# Altium footprint library mobinbyn-Socket.PcbLib: 131 footprints (part 4 of 9)
Each footprint in its own frame and in the unit in brackets; x right, y up, seen from the top. Pads: shape width x height; smd on the part's side, far side on the other; paste and mask are expansions set on the pad; w line width, h text height; cw(c..) or ccw(c..) is an arc to the next point about the centre after c.
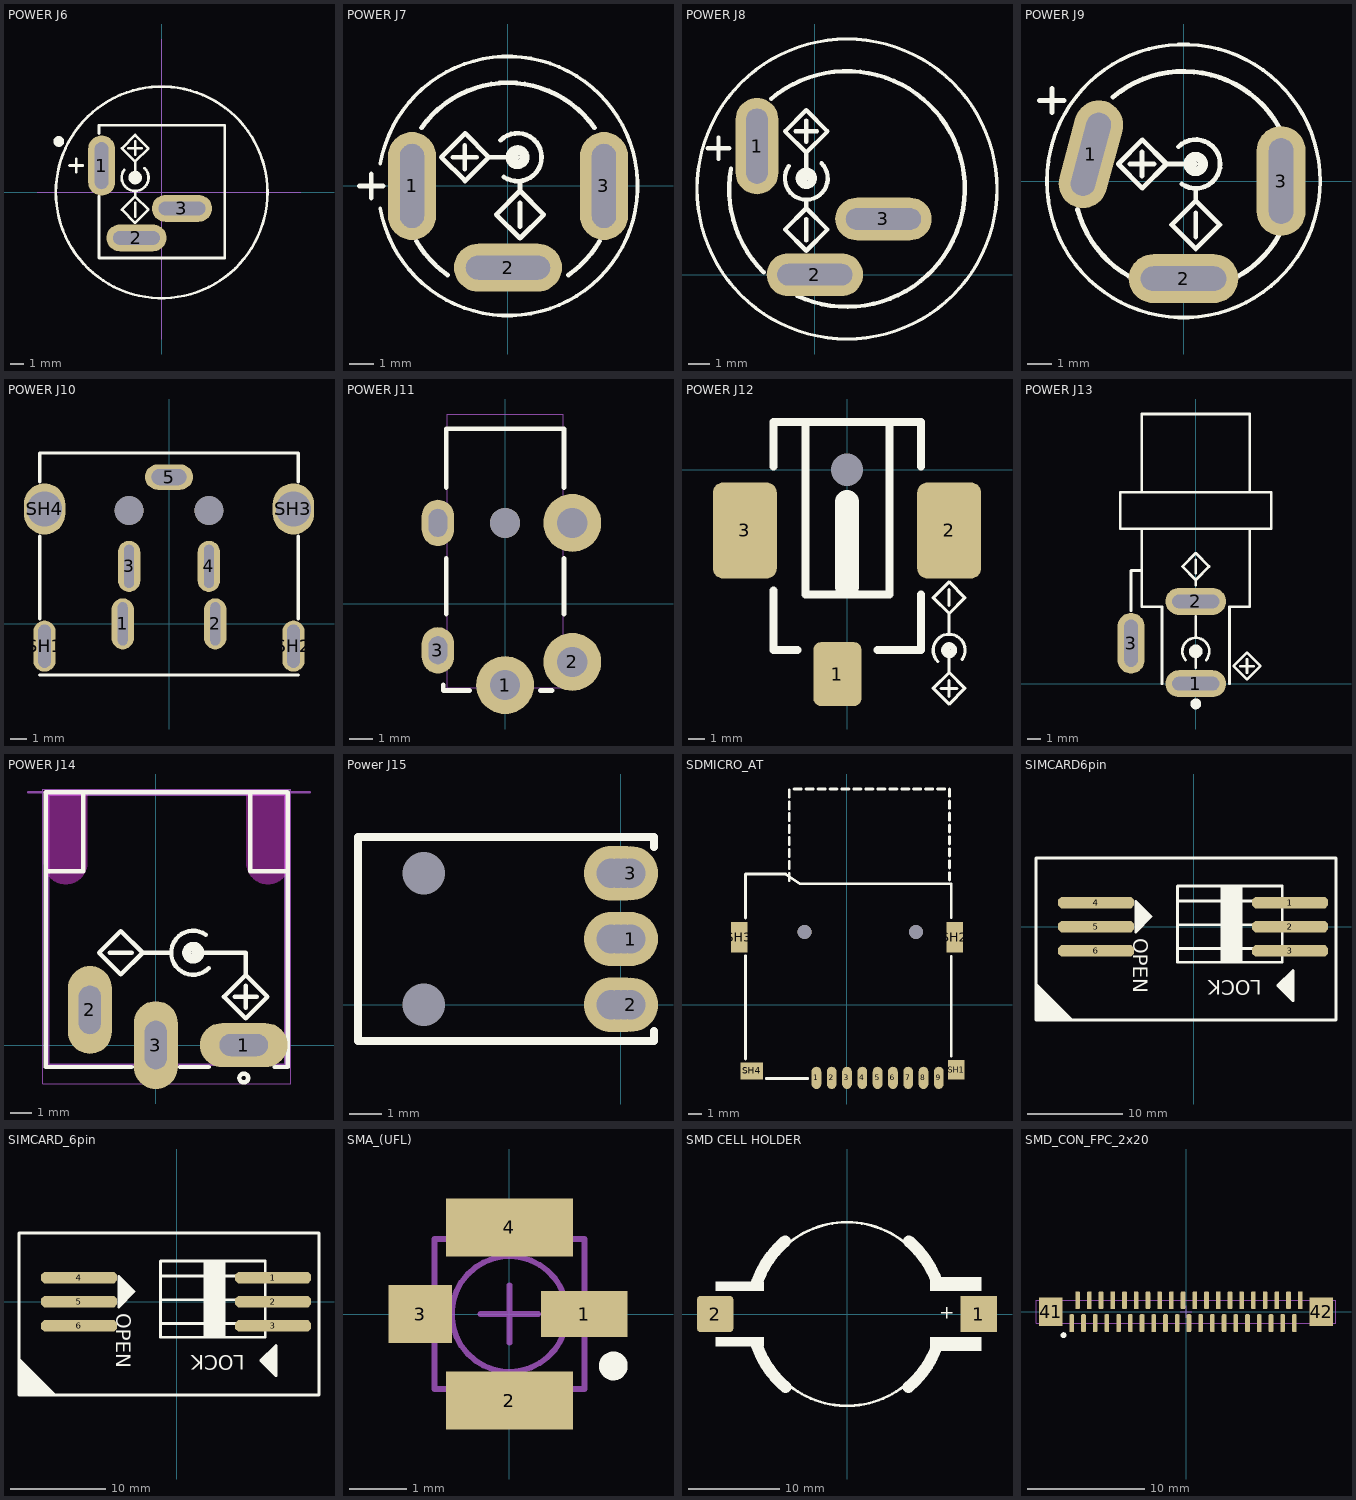
[diagram p3: the footprints below, top view; thin cyan lines are the x and y axes]

## POWER J6 [mm] "DC POWER JACK, 2.0mm Dia, PJ-011A"
height 13
pads (3):
  oval 2x4.5 hole 1 slot 3.5 at 90 deg: 1(-4.5,2)
  oval 4.5x2 hole 1 slot 3.5 at 0 deg: 2(-1.9,-3.4) 3(1.5,-1.2)
Top Overlay:
  circle w0.4: c-2,1.1 r0.3
  circle w0.2: c-0.02,0 r7.9
  circle w0.4: c-7.7,3.8 r0.2
  lines w0.2: -6.9,2 -5.9,2 ; -6.4,1.5 -6.4,2.5 ; -4.7,-0.3 -4.7,-4.9 4.7,-4.9 4.7,5 -4.7,5 -4.7,4.4 ; -2.819,1.674 ccw(c-2,1.1) -1.293,1.807 ; -2.5,3.3 -1.5,3.3 ; -2,-1.8 -2,-0.8 ; -2,0.1 -2,-0.3 ; -2,1.1 -2,2.3 ; -2,2.8 -2,3.8 ; -2,-0.3 -2.99,-1.29 -2,-2.28 -1.01,-1.29 -2,-0.3 ; -2,2.3 -1.01,3.29 -2,4.28 -2.99,3.29 -2,2.3
Mechanical 1:
  lines w0.001: -4.92,0.25 -4.12,0.25 -4.12,3.75 -4.92,3.75 -4.92,0.25 ; -3.4,-3.7 -3.4,-3.1 -0.4,-3.1 -0.4,-3.7 -3.4,-3.7 ; 0,-1.55 0,-0.95 3,-0.95 3,-1.55 0,-1.55
Mechanical 4:
  circle w0.127: c-0.02,0 r7.9
  circle w0.127: c-0.02,0 r7.9
  lines w0.05: -9.32,0 10.38,0 -9.32,0 ; -0.02,-10.95 -0.02,11.45 -0.02,-10.95
3D body "CUI_PJ-011A.step": height 13.3, standoff -4.6, extent -8.66,-7.9 8.66,7.9

## POWER J7 [mm] "DC POWER JACK, 2.1mm Dia, PJ-005A"
height 19
pads (3):
  oval 2x4.5 hole 1 slot 3.5 at 90 deg: 1(-4,0) 3(4,0)
  oval 4.5x2 hole 1 slot 3.5 at 0 deg: 2(0,-3.4)
Top Overlay:
  circle w0.4: c0.4,1.2 r0.3
  lines w0.15: -5.318,-0.938 ccw(c0,0) -5.318,0.938
  lines w0.2: -6.2,0 -5.2,0 ; -5.7,-0.5 -5.7,0.5 ; -3.811,-2.3 ccw(c0,-0.1) -2.524,-3.704 ; -3.604,2.424 cw(c0,-0.1) 3.604,2.424 ; -2.3,1.2 -1.3,1.2 ; -1.8,0.7 -1.8,1.7 ; -0.307,1.907 cw(c0.4,1.2) -0.174,0.381 ; 0.4,1.2 -0.8,1.2 ; 0.5,-1.7 0.5,-0.7 ; 0.5,0.2 0.5,-0.2 ; 2.524,-3.704 ccw(c0,-0.1) 3.811,-2.3 ; -0.8,1.2 -1.79,0.21 -2.78,1.2 -1.79,2.19 -0.8,1.2 ; 0.5,-0.2 1.49,-1.19 0.5,-2.18 -0.49,-1.19 0.5,-0.2
3D body "CUI_PJ-005A.step": height 16.15, standoff -4.75, extent -5.275,-5.773 5.275,5.774

## POWER J8 [mm] "DC POWER JACK, 2.1mm Dia, DC-022"
height 19
pads (3):
  oval 2x4.5 hole 1 slot 3.5 at 90 deg: 1(-2.7,6)
  oval 4.5x2 hole 1 slot 3.5 at 0 deg: 2(0,0) 3(3.2,2.6)
Top Overlay:
  circle w0.15: c1.5,4 r7
  circle w0.4: c-0.4,4.5 r0.3
  lines w0.2: -5,5.9 -4,5.9 ; -4.5,5.4 -4.5,6.4 ; -3.916,4.955 ccw(c1.5,4) -2.389,0.111 ; -2.035,8.213 cw(c1.5,4) -0.824,-0.985 ; -1.219,5.074 ccw(c-0.4,4.5) 0.307,5.207 ; -0.9,6.7 0.1,6.7 ; -0.4,1.6 -0.4,2.6 ; -0.4,3.5 -0.4,3.1 ; -0.4,4.5 -0.4,5.7 ; -0.4,6.2 -0.4,7.2 ; -0.4,3.1 -1.39,2.11 -0.4,1.12 0.59,2.11 -0.4,3.1 ; -0.4,5.7 0.59,6.69 -0.4,7.68 -1.39,6.69 -0.4,5.7
3D body "User Library-KLS1-DC-022B.step": height 13.8, standoff -4.5, extent -6,-4.66 9,12.66

## POWER J9 [mm] "DC POWER JACK, 2.1mm Dia, SWITCHCRAFT 721A"
height 19
pads (3):
  oval 2x4.5 hole 1 slot 3.5 at 75 deg rot 165: 1(-3.8,1.1)
  oval 4.5x2 hole 1 slot 3.5 at 0 deg: 2(0,-4)
  oval 2x4.5 hole 1 slot 3.5 at 90 deg: 3(4,0)
Top Overlay:
  circle w0.4: c0.5,0.7 r0.3
  circle w0.15: c0,0 r5.6
  lines w0.2: -5.9,3.3 -4.9,3.3 ; -5.4,2.8 -5.4,3.8 ; -4.347,-1.165 ccw(c0,0) -2.25,-3.897 ; -2.893,3.447 cw(c0,0) 3.897,2.25 ; -2.2,0.7 -1.2,0.7 ; -1.7,0.2 -1.7,1.2 ; -0.207,1.407 cw(c0.5,0.7) -0.074,-0.119 ; 0.5,-2.3 0.5,-1.3 ; 0.5,-0.4 0.5,-0.8 ; 0.5,0.7 -0.7,0.7 ; 2.25,-3.897 ccw(c0,0) 3.897,-2.25 ; -0.7,0.7 -1.69,-0.29 -2.68,0.7 -1.69,1.69 -0.7,0.7 ; 0.5,-0.8 1.49,-1.79 0.5,-2.78 -0.49,-1.79 0.5,-0.8
3D body "721A_edited.STEP": height 16.06, standoff -4.77, extent -5.512,-5.512 5.512,5.512

## POWER J10 [mm] "Power Connector, KPJX-4S-S"
height 5
pads (11):
  oval 1.4x3.2 hole 0.6 slot 2.7 at 90 deg: 1(-2.9,0) 2(2.9,0) 3(-2.5,3.6) 4(2.5,3.6)
  oval 3x1.6 hole 1 slot 2.2 at 0 deg: 5(0,9.2)
  oval 1.4x3.2 hole 0.8 slot 2.7 at 90 deg: SH1(-7.8,-1.4) SH2(7.8,-1.4)
  oval 2.6x3.2 hole 2.2: SH3(7.8,7.2) SH4(-7.8,7.2)
  round 1.8 hole 1.8 unplated: ""(-2.5,7.1) ""(2.5,7.1)
Top Overlay:
  lines w0.2: -8.1,-3.2 8.1,-3.2 ; -8.1,0.3 -8.1,5.5 ; -8.1,8.9 -8.1,10.7 8.1,10.7 8.1,8.9 ; 8.1,0.3 8.1,5.5
3D body "User Library-KPJX-4S-S.step": height 15, standoff -3.5, extent -8,-3.05 8,14.6

## POWER J11 [mm] "DC POWER JACK, 0.7mm ID, 2.35mm OD"
height 5
pads (6):
  round 2.5 hole 1.3: 1(0,-3.5) 2(2.9,-2.5) ""(2.9,3.5)
  oval 1.4x2 hole 0.8 slot 1.2 at 90 deg: 3(-2.9,-2) ""(-2.9,3.5)
  round 1.3 hole 1.3 unplated: ""(0,3.5)
Top Overlay:
  lines w0.2: -2.667,-3.484 -2.667,-3.738 -1.524,-3.738 ; -2.54,-0.436 -2.54,1.977 ; -2.54,5.025 -2.54,7.565 2.54,7.565 2.54,5.025 ; 1.524,-3.738 2.032,-3.738 ; 2.54,-0.436 2.54,1.977
Mechanical 13:
  lines w0.05: -2.819,-2.506 -2.819,-1.515 ; -2.819,3.006 -2.819,3.996 ; -2.502,-2.506 -3.073,-2.506 -3.073,-1.515 -2.502,-1.515 ; -2.502,3.006 -3.073,3.006 -3.073,3.996 -2.502,3.996 ; -0.495,-3.611 -0.495,-3.738 0.495,-3.738 0.495,-3.611 ; 2.502,-2.989 3.073,-2.989 3.073,-1.998 2.502,-1.998 ; 2.502,3.006 3.073,3.006 3.073,3.996 2.502,3.996 ; 2.819,-2.989 2.819,-1.998 ; 2.819,3.006 2.819,3.996 ; -2.502,-3.611 2.502,-3.611 2.502,8.2 -2.502,8.2 -2.502,-3.611
3D body "Conn_Kobiconn_163-4307-E.stp": height 5, standoff -2.5, extent -3.309,-3.855 3.309,8.2

## POWER J12 [mm] "DC POWER JACK, CUI PJ-036A-SMT"
pads (4):
  rrect30% 3x4 smd: 1(-0.6,-12.8)
  rrect30% 4x6 smd: 2(6.4,-3.8) 3(-6.4,-3.8)
  rrect30% 0x0 hole 2.032 unplated: 4(0,0)
Top Overlay:
  circle w0.4: c6.4,-11.3 r0.3
  lines w0.2: 5.693,-12.007 cw(c6.4,-11.3) 7.219,-11.874 ; 5.9,-13.7 6.9,-13.7 ; 6.4,-14.2 6.4,-13.2 ; 6.4,-11.3 6.4,-12.7 ; 6.4,-10.3 6.4,-9 ; 6.4,-8.5 6.4,-7.5 ; 6.4,-12.7 7.39,-13.69 6.4,-14.68 5.41,-13.69 6.4,-12.7 ; 6.4,-9 5.41,-8.01 6.4,-7.02 7.39,-8.01 6.4,-9
  lines w0.5: -4.6,-7.55 -4.6,-11.3 -3.1,-11.3 ; -4.6,0.2 -4.6,3 4.65,3 4.65,0.2 ; -2.6,3 -2.6,-7.8 2.65,-7.8 2.65,2.9 ; 1.9,-11.3 4.65,-11.3 4.65,-7.8
  lines w1.5: 0,-7.3 0,-2
3D body "CUI-PJ-036A-SMT.step": height 11.09, standoff -1.51, extent -7.5,-14.1 7.7,3

## POWER J13 [mm] "DC POWER JACK, 2.1mm Dia, PJ-066A, right angled"
height 19
pads (3):
  oval 4.5x2 hole 1 slot 3.5 at 0 deg: 1(0,0) 2(0,6.1)
  oval 2x4.5 hole 1 slot 3.5 at 90 deg: 3(-4.8,3)
Top Overlay:
  circle w0.4: c0,2.4 r0.3
  circle w0.4: c0,-1.5 r0.2
  lines w0.2: -4.8,5.4 -4.8,8.4 -4,8.4 ; -4,11.5 -4,5.7 -2.5,5.7 -2.5,0 ; -0.766,1.757 cw(c0,2.4) 0.766,1.757 ; 0,1.2 0,2.4 ; 0,3.4 0,5 ; 0,7.3 0,7.7 ; 0,8.2 0,9.2 ; 2.5,0 2.5,5.7 4,5.7 4,11.5 ; 3.3,1.3 4.3,1.3 ; 3.8,0.8 3.8,1.8 ; -4,14.2 -5.6,14.2 -5.6,11.5 5.6,11.5 5.6,14.2 4,14.2 ; -4,14.2 4,14.2 ; -4,14.2 -4,20 4,20 4,14.2 ; 0,7.7 0.99,8.69 0,9.68 -0.99,8.69 0,7.7 ; 2.81,1.31 3.8,2.3 4.79,1.31 3.8,0.32 2.81,1.31
3D body "CUI_PJ-066A.step": height 12.25, standoff -2.85, extent -5.5,-0.15 5.5,19.9

## POWER J14 [mm] "DC POWER JACK, CUI Inc. PJ-003A, 7.8mm Height, 2mm Center pin"
height 7.8
pads (3):
  oval 4x2 hole 1 slot 2.2 at 0 deg: 1(4,0)
  oval 2x4 hole 1 slot 2.2 at 90 deg: 2(-3,1.6) 3(0,0)
Top Overlay:
  circle w0.4: c1.7,4.2 r0.3
  circle w0.2: c4,-1.5 r0.2
  lines w0.2: -5,11.4 -5,-1 -1.1,-1 ; -3.3,11.4 -3.3,7.9 -5,7.9 -5,11.5 6,11.5 6,7.9 4.3,7.9 4.3,11.4 ; -2.1,4.2 -1.1,4.2 ; 0.7,4.2 -0.6,4.2 ; 1.1,-1 2.4,-1 ; 1.7,4.2 4.1,4.2 4.1,3.2 4.09,3.19 ; 2.274,5.019 ccw(c1.7,4.2) 2.407,3.493 ; 3.6,2.2 4.6,2.2 ; 4.1,1.7 4.1,2.7 ; 5.4,-1 6,-1 6,11.4 ; -0.6,4.2 -1.59,5.19 -2.58,4.2 -1.59,3.21 -0.6,4.2 ; 4.09,3.19 5.08,2.2 4.09,1.21 3.1,2.2 4.09,3.19
Keep-Out Layer:
  board cut-out: 6,11.5 6,8.3 6,8.211 5.965,8.037 5.898,7.874 5.799,7.726 5.674,7.601 5.526,7.502 5.363,7.435 5.189,7.4 5.1,7.4 5.011,7.4 4.837,7.435 4.674,7.502 4.526,7.601 4.401,7.726 4.302,7.874 4.235,8.037 4.2,8.211 4.2,8.3 4.2,11.5
  board cut-out: -5,11.5 -5,8.3 -5,8.211 -4.965,8.037 -4.898,7.874 -4.799,7.726 -4.674,7.601 -4.526,7.502 -4.363,7.435 -4.189,7.4 -4.1,7.4 -4.011,7.4 -3.837,7.435 -3.674,7.502 -3.526,7.601 -3.401,7.726 -3.302,7.874 -3.235,8.037 -3.2,8.211 -3.2,8.3 -3.2,11.5
Keep-Out Layer:
  lines w0.2: -5,8.3 ccw(c-4.1,8.3) -3.2,8.3 -3.2,11.5 -5,11.5 -5,8.3 ; 4.2,8.3 ccw(c5.1,8.3) 6,8.3 6,11.5 4.2,11.5 4.2,8.3
Mechanical 1:
  lines w0.1: -5.8,11.5 7,11.5
  lines w0.127: -4.9,-0.9 5.9,-0.9 5.9,11.4 -4.9,11.4 -4.9,-0.9
Mechanical 4:
  lines w0.05: -5.15,-1.76 6.15,-1.76 6.15,11.65 -5.15,11.65 -5.15,-1.76
3D body "CUI_PJ-003A.step": height 7.8, standoff -2.9, extent -4.9,-0.9 5.9,11.4

## Power J15 [mm] "DC Power Jack Model DS-213"
height 5
pads (5):
  round 1.651 hole 0.889: 1(0.3,2) 2(0.3,0) 3(0.3,4)
  round 0 hole 1.3: MH(-6,0) MH(-6,4)
via -0.3,0 diameter 1.651 hole 0.889
via -0.1,0 diameter 1.651 hole 0.889
via 0.1,0 diameter 1.651 hole 0.889
via -0.3,2 diameter 1.651 hole 0.889
via -0.1,2 diameter 1.651 hole 0.889
via 0.1,2 diameter 1.651 hole 0.889
via -0.3,4 diameter 1.651 hole 0.889
via -0.1,4 diameter 1.651 hole 0.889
via 0.1,4 diameter 1.651 hole 0.889
Top Overlay:
  lines w0.25: 1,-0.8 1,-1.1 -8,-1.1 -8,5.1 1,5.1 1,4.8
3D body "User Library-DS-213.STEP": height 5, standoff -3.5, extent -8,-1.1 1,5.1

## SDMICRO_AT [mm] "SDMICRO, Attend 112J-TDAR-R01, push-push"
height 1
pads (15):
  oval 0.7x1.6 smd: 1(-2.2,-5.25) 2(-1.1,-5.25) 3(0,-5.25) 4(1.1,-5.25) 5(2.2,-5.25) 6(3.3,-5.25) 7(4.4,-5.25) 8(5.5,-5.25) 9(6.6,-5.25)
  rect 1.2x1.4 smd: SH1(7.85,-4.65)
  rect 1.2x2.2 smd: SH2(7.75,4.85) SH3(-7.75,4.85)
  rect 1.6x1.2 smd: SH4(-6.85,-4.75)
  round 1 hole 1 unplated: ""(-3.05,5.25) ""(4.95,5.25)
Top Overlay:
  lines w0.2: -7.3,-3.9 -7.3,3.53 ; -7.3,6.25 -7.3,9.4 -4.409,9.4 -3.399,8.7 7.5,8.7 7.5,6.26 ; -5.8,-5.3 -2.82,-5.3 ; -4.16,8.93 -4.16,9.45 ; -4.16,9.79 -4.16,10.31 ; -4.16,10.65 -4.16,11.17 ; -4.16,11.51 -4.16,12.03 ; -4.16,12.37 -4.16,12.89 ; -4.16,13.23 -4.16,13.75 ; -4.16,14.09 -4.16,14.61 ; -4.16,14.95 -4.16,15.47 ; -3.81,15.52 -3.29,15.52 ; -2.95,15.52 -2.43,15.52 ; -2.09,15.52 -1.57,15.52 ; -1.23,15.52 -0.71,15.52 ; -0.37,15.52 0.15,15.52 ; 0.49,15.52 1.01,15.52 ; 1.35,15.52 1.87,15.52 ; 2.21,15.52 2.73,15.52 ; 3.07,15.52 3.59,15.52 ; 3.93,15.52 4.45,15.52 ; 4.79,15.52 5.31,15.52 ; 5.65,15.52 6.17,15.52 ; 6.51,15.52 7.03,15.52 ; 7.37,8.98 7.37,9.5 ; 7.37,9.84 7.37,10.36 ; 7.37,10.7 7.37,11.22 ; 7.37,11.56 7.37,12.08 ; 7.37,12.42 7.37,12.94 ; 7.37,13.28 7.37,13.8 ; 7.37,14.14 7.37,14.66 ; 7.37,15 7.37,15.52 ; 7.5,-3.7 7.5,3.5
3D body "User Library-Micro_SD.step": height 1.15, standoff 0.17, extent -3.976,-1.179 7.024,13.821
3D body "112J-TXAR-R_C_1.stp": height 1.85, standoff -0.6, extent -8,-5.702 8.1,9.3

## SIMCARD6pin [mm]
pads (6):
  oct 8x1.2 smd: 1(10.138,2.54) 2(10.138,0) 3(10.138,-2.54) 4(-10.238,2.54) 5(-10.238,0) 6(-10.238,-2.54)
Top Overlay:
  rectangle: 2.829,-3.79 5.13,4.262
  region: 10.45,-4.585 10.45,-7.785 8.85,-6.185
  region: -16.562,-6.019 -12.786,-9.795 -16.562,-9.795
  lines w0.254: -16.562,-6.019 -12.786,-9.795
  lines w0.3: -5.874,2.214 -5.874,-0.087 -4.823,0.963 -4.823,1.113 -5.724,2.014 ; -5.724,0.413 -5.724,1.864 ; -5.524,1.614 -5.524,0.563 -5.474,0.513 ; -5.373,0.663 -5.073,0.963 ; -5.373,1.564 -5.373,0.963 -5.273,0.863 ; -5.223,1.364 -5.223,1.063 -5.173,1.013 ; -5.023,1.113 -5.023,1.163 ; -1.689,-2.287 9.311,-2.287 ; -1.689,0.213 9.311,0.213 ; -1.689,2.714 9.311,2.714 ; -16.562,-9.795 14.962,-9.795 14.962,7.213 -16.562,7.213 -16.562,-9.795 ; -6.074,-0.537 -4.473,1.063 -6.074,2.664 -6.074,-0.537 ; -1.689,-3.738 -1.689,4.262 9.311,4.262 9.311,-3.738 -1.689,-3.738 ; 8.85,-6.185 10.45,-4.585 10.45,-7.785 8.85,-6.185
  text "LOCK" at 7.138,-5.611 h1.52
  text "OPEN" at -6.362,-1.211 h1.52
3D body "User Library-SIM holder 115B-AAA0-R.SLDPRT": height 2.35, standoff -0.7, extent -16.628,-9.87 13.072,7.33

## SIMCARD_6pin [mm]
pads (6):
  oct 8x1.2 smd: 1(10.138,2.54) 2(10.138,0) 3(10.138,-2.54) 4(-10.238,2.54) 5(-10.238,0) 6(-10.238,-2.54)
Top Overlay:
  rectangle: 2.829,-3.79 5.13,4.262
  region: -16.562,-6.019 -12.786,-9.795 -16.562,-9.795
  region: 10.45,-4.585 10.45,-7.785 8.85,-6.185
  lines w0.254: -16.562,-6.019 -12.786,-9.795
  lines w0.3: -5.874,2.214 -5.874,-0.087 -4.823,0.963 -4.823,1.113 -5.724,2.014 ; -5.724,0.413 -5.724,1.864 ; -5.524,1.614 -5.524,0.563 -5.474,0.513 ; -5.373,0.663 -5.073,0.963 ; -5.373,1.564 -5.373,0.963 -5.273,0.863 ; -5.223,1.364 -5.223,1.063 -5.173,1.013 ; -5.023,1.113 -5.023,1.163 ; -1.689,-2.287 9.311,-2.287 ; -1.689,0.213 9.311,0.213 ; -1.689,2.714 9.311,2.714 ; -16.562,-9.795 -16.562,7.213 14.962,7.213 14.962,-9.795 -16.562,-9.795 ; -6.074,-0.537 -6.074,2.664 -4.473,1.063 -6.074,-0.537 ; -1.689,-3.738 9.311,-3.738 9.311,4.262 -1.689,4.262 -1.689,-3.738 ; 8.85,-6.185 10.45,-7.785 10.45,-4.585 8.85,-6.185
  text "OPEN" at -6.362,-1.211 h1.52
  text "LOCK" at 7.138,-5.611 h1.52
3D body "User Library-SIM5060-6-0-26-01-A.STEP": height 2.6, standoff -0.7, extent -16.41,-9.87 13.23,7.33

## SMA_(UFL) [mm]
pads (4):
  rect 1.5x0.8 smd: 1(1.3,0)
  rect 2.2x1 smd: 2(0,-1.5) 4(0,1.5)
  rect 1.1x1 smd: 3(-1.55,0)
Top Overlay:
  circle w0.25: c1.8,-0.9 r0.125
Mechanical 13:
  circle w0.1: c0,0 r1
  lines w0.1: -1.3,-1.3 -1.3,1.3 1.3,1.3 1.3,-1.3 -1.3,-1.3
Mechanical 15:
  lines w0.1: -0.5,0 0.5,0 ; 0,-0.5 0,0.5
3D body "User Library-UFL-R-SMD.STEP": height 1.25, standoff 0, extent -1.55,-1.7 1.55,1.7

## SMD CELL HOLDER [mm]
pads (2):
  rect 4x4 smd: 1(14.5,0)
  rrect20% 4x4 smd: 2(-14.5,0)
Top Overlay:
  region: -14.478,3.556 -14.478,2.54 -9.144,2.54 -9.144,3.556
  region: -9.144,-3.556 -9.144,-2.54 -14.478,-2.54 -14.478,-3.556
  region: 14.808,-4.064 14.808,-2.54 9.144,-2.54 9.144,-4.064
  region: 9.144,4.064 9.144,2.54 14.808,2.54 14.808,4.064
  lines w0.3: -7.122,-7.161 ccw(c0,0) 7.122,-7.161 ; -6.534,7.701 cw(c0,0) 6.534,7.701
  lines w1.3: -9.899,-3.5 ccw(c0,0) -6.771,-8.025 ; -9.897,3.508 cw(c0,0) -6.793,8.006 ; 6.771,-8.025 ccw(c0,0) 9.801,-3.766 ; 6.793,8.006 cw(c0,0) 9.801,3.766
  text "+" at 10.16,-0.508 h1.5
3D body "SMD_Cell_Holder_Full.STEP": height 5.4, standoff 0, extent -15.9,-10 15.9,10

## SMD_CON_FPC_2x20 [mm] "FPC-XXS1VN3R"
pads (42):
  rrect50% 0.4x1.524 smd: 1(-9.75,-0.975) 2(-9.25,0.975) 3(-8.75,-0.975) 4(-8.25,0.975) 5(-7.75,-0.975) 6(-7.25,0.975) 7(-6.75,-0.975) 8(-6.25,0.975) 9(-5.75,-0.975) 10(-5.25,0.975) 11(-4.75,-0.975) 12(-4.25,0.975) 13(-3.75,-0.975) 14(-3.25,0.975) 15(-2.75,-0.975) 16(-2.25,0.975) 17(-1.75,-0.975) 18(-1.25,0.975) 19(-0.75,-0.975) 20(-0.25,0.975) 21(0.25,-0.975) 22(0.75,0.975) 23(1.25,-0.975) 24(1.75,0.975) 25(2.25,-0.975) 26(2.75,0.975) 27(3.25,-0.975) 28(3.75,0.975) 29(4.25,-0.975) 30(4.75,0.975) 31(5.25,-0.975) 32(5.75,0.975) 33(6.25,-0.975) 34(6.75,0.975) 35(7.25,-0.975) 36(7.75,0.975) 37(8.25,-0.975) 38(8.75,0.975) 39(9.25,-0.975) 40(9.75,0.975)
  rect 2x2.4 smd: 41(-11.55,0) 42(11.55,0)
Top Overlay:
  circle w0.25: c-10.45,-2 r0.125
Mechanical 13:
  lines w0.1: -12.8,-1 12.8,-1 12.8,1 -12.8,1 -12.8,-1
Mechanical 15:
  lines w0.1: -0.5,0 0.5,0 ; 0,-0.5 0,0.5
3D body "ZIF connector.stp": height 4.47, standoff -0.02, extent -12.118,-1.454 12.182,1.483